# Altium footprint library bethu.PcbLib: 628 footprints (part 10 of 40)
Each footprint in its own frame and in the unit in brackets; x right, y up, seen from the top. Pads: shape width x height; smd on the part's side, far side on the other; paste and mask are expansions set on the pad; w line width, h text height; cw(c..) or ccw(c..) is an arc to the next point about the centre after c.
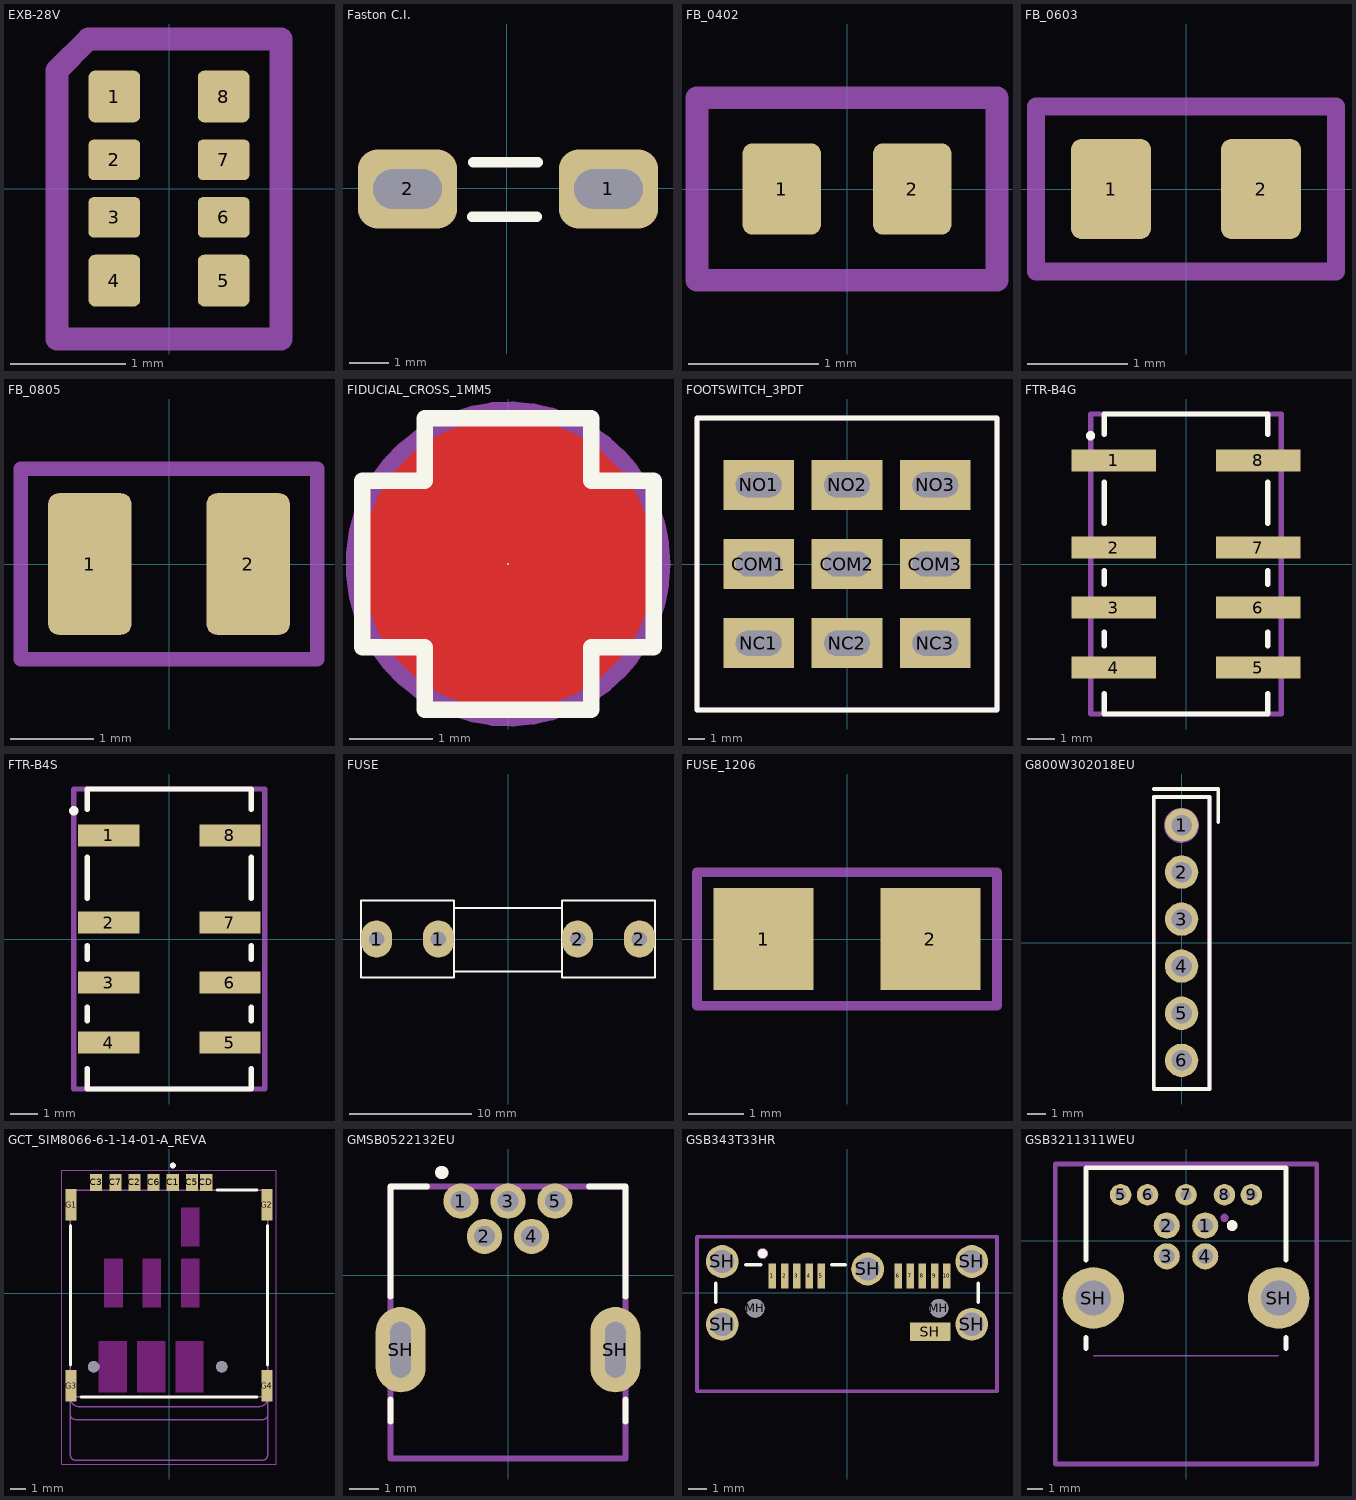
[diagram p9: the footprints below, top view; thin cyan lines are the x and y axes]

## EXB-28V [mm]
pads (8):
  rrect25% 0.45x0.45 smd mask+0.1: 1(-0.475,0.8) 4(-0.475,-0.8) 5(0.475,-0.8) 8(0.475,0.8)
  rrect25% 0.45x0.35 smd mask+0.1: 2(-0.475,0.25) 3(-0.475,-0.25) 6(0.475,-0.25) 7(0.475,0.25)
Mechanical 13:
  lines w0.2: -0.975,-1.308 -0.975,1.025 -0.7,1.3 0.975,1.3 0.975,-1.308 -0.975,-1.308
  text "'.Designator'" at -5.665,-0.417 h1
3D body "R-Array-0402.step": height 0.45, standoff 0, extent -0.5,-1 0.5,1

## Faston C.I. [mm]
pads (2):
  rrect50% 2.5x2 hole 1 slot 1.73 at 0 deg: 1(2.575,-0.025) 2(-2.5,-0.025)
Top Overlay:
  lines w0.254: -0.875,-0.725 0.775,-0.725 ; -0.85,0.65 0.8,0.65
3D body "amp faston tab 63824.step": height 11.52, standoff -2.5, extent -3.925,-1.57 3.995,1.52

## FB_0402 [mm]
pads (2):
  rrect25% 0.6x0.7 smd: 1(-0.5,0) 2(0.5,0)
Mechanical 13:
  lines w0.175: -1.15,-0.7 -1.15,0.7 1.15,0.7 1.15,-0.7 -1.15,-0.7
  text "'.Designator'" at -5.665,-0.417 h1
3D body "FB0402.stp": height 0.51, standoff 0.01, extent -0.5,-0.25 0.5,0.25

## FB_0603 [mm]
pads (2):
  rrect25% 0.8x1 smd: 1(-0.75,0) 2(0.75,0)
Mechanical 13:
  lines w0.175: -1.5,-0.825 1.5,-0.825 1.5,0.825 -1.5,0.825 -1.5,-0.825
  text "'.Designator'" at -5.665,-0.417 h1
3D body "FB-0603.STEP": height 0.81, standoff 0.01, extent -0.8,-0.4 0.8,0.4

## FB_0805 [mm]
pads (2):
  rrect25% 1x1.7 smd: 1(-0.95,0) 2(0.95,0)
Mechanical 13:
  lines w0.175: -1.778,-1.143 -1.778,1.143 1.778,1.143 1.778,-1.143 -1.778,-1.143
  text "'.Designator'" at -5.665,-0.417 h1
3D body "FB_0805.STEP": height 0.86, standoff 0.01, extent -1,-0.625 1,0.625

## FIDUCIAL_CROSS_1MM5 [mil]
pads (1):
  round 1 smd paste-19.68: FM(0,0)
Top Layer:
  region: -9.84,-29.53 -9.84,-9.84 -29.53,-9.84 -29.53,9.84 -9.84,9.84 -9.84,29.53 9.84,29.53 9.84,9.84 29.53,9.84 29.53,-9.84 9.84,-9.84 9.84,-29.53
  pour cut-out: 0,68.9 6.79,68.9 20.1,66.25 32.64,61.06 43.92,53.52 53.52,43.92 61.06,32.64 66.25,20.1 68.9,6.79 68.9,0 68.9,-6.79 66.25,-20.1 61.06,-32.64 53.52,-43.92 43.92,-53.52 32.64,-61.06 20.1,-66.25 6.79,-68.9 0,-68.9 -6.79,-68.9 -20.1,-66.25 -32.64,-61.06 -43.92,-53.52 -53.52,-43.92 -61.06,-32.64 -66.25,-20.1 -68.9,-6.79 -68.9,0 -68.9,6.79 -66.25,20.1 -61.06,32.64 -53.52,43.92 -43.92,53.52 -32.64,61.06 -20.1,66.25 -6.79,68.9
Top Overlay:
  lines w7.87: -68.9,-39.37 -39.37,-39.37 -39.37,-68.9 39.37,-68.9 39.37,-39.37 68.9,-39.37 68.9,39.37 39.37,39.37 39.37,68.9 -39.37,68.9 -39.37,39.37 -68.9,39.37 -68.9,0 -68.9,-39.37
Top Solder:
  region: -59.06,29.53 -29.53,29.53 -29.53,59.06 29.53,59.06 29.53,29.53 59.06,29.53 59.06,-29.53 29.53,-29.53 29.53,-59.06 -29.53,-59.06 -29.53,-29.53 -59.06,-29.53
Mechanical 13:
  circle w11.81: c0,0 r70.98
  text "'.Designator'" at -223.03,-16.4 h39.37

## FOOTSWITCH_3PDT [mm]
pads (9):
  rect 4.25x3 hole 1.5 slot 2.75 at 0 deg: COM1(-5.3,0) COM2(0,0) COM3(5.3,0) NC1(-5.3,-4.75) NC2(0,-4.75) NC3(5.3,-4.75) NO1(-5.3,4.75) NO2(0,4.75) NO3(5.3,4.75)
Top Overlay:
  lines w0.3: -9,-8.75 -9,8.75 -6.5,8.75 9,8.75 9,-8.75 -9,-8.75
Mechanical 13:
  lines w0.3: -9,-8.75 -9,8.75 9,8.75 9,-8.75 -9,-8.75
  text "'.Designator'" at -5.665,-0.417 h1
3D body "3PDT_Footswitch_NoNutNoWasher.step": height 37.96, standoff -4.14, extent -9.8,-8.5 9.8,8.5

## FTR-B4G [mm]
pads (8):
  rect 3.1x0.8 smd: 1(-2.65,3.8) 2(-2.65,0.6) 3(-2.65,-1.6) 4(-2.65,-3.8) 5(2.65,-3.8) 6(2.65,-1.6) 7(2.65,0.6) 8(2.65,3.8)
Top Overlay:
  circle w0.3: c-3.5,4.7 r0.021
  lines w0.2: -3,-4.75 -3,-5.5 3,-5.5 3,-4.75 ; -3,-3 -3,-2.5 ; -3,-0.75 -3,-0.25 ; -3,1.5 -3,3 ; -3,4.75 -3,5.5 3,5.5 3,4.75 ; 3,-3 3,-2.5 ; 3,-0.75 3,-0.25 ; 3,1.5 3,3
Mechanical 13:
  circle w0.3: c-2.2,3.8 r0.108
  lines w0.2: -3.5,-5.5 3.5,-5.5 3.5,5.5 -3.5,5.5 -3.5,-5.5
  text ".Designator" at -4.998,-0.333 h1
3D body "FTR-B4G.step": height 9.72, standoff 0.01, extent -3.706,-5.3 3.7,5.3

## FTR-B4S [mm]
pads (8):
  rect 2.25x0.8 smd: 1(-2.225,3.8) 2(-2.225,0.6) 3(-2.225,-1.6) 4(-2.225,-3.8) 5(2.225,-3.8) 6(2.225,-1.6) 7(2.225,0.6) 8(2.225,3.8)
Top Overlay:
  circle w0.3: c-3.5,4.7 r0.021
  lines w0.2: -3,-4.75 -3,-5.5 3,-5.5 3,-4.75 ; -3,-3 -3,-2.5 ; -3,-0.75 -3,-0.25 ; -3,1.5 -3,3 ; -3,4.75 -3,5.5 3,5.5 3,4.75 ; 3,-3 3,-2.5 ; 3,-0.75 3,-0.25 ; 3,1.5 3,3
Mechanical 13:
  circle w0.3: c-2.2,3.8 r0.108
  lines w0.2: -3.5,-5.5 3.5,-5.5 3.5,5.5 -3.5,5.5 -3.5,-5.5
  text ".Designator" at -4.998,-0.333 h1
3D body "FTR-B4S.step": height 9.72, standoff 0.01, extent -2.852,-5.3 2.85,5.3

## FUSE [mil]
pads (4):
  oval 100x120 hole 50: 1(-425,0) 1(-225,0) 2(225,0) 2(425,0)
Top Overlay:
  lines w7: -175,-105 175,-105 ; -175,100 175,100 ; -475,-125 -175,-125 -175,125 -475,125 -475,-125 ; 175,-125 175,125 475,125 475,-125 175,-125
3D body "SW3dPS-Fuse Leg_2009.STEP": height 377.88, standoff -129.94, extent -448,-117 -208,126.71
3D body "SW3dPS-Fuse Small 1A.STEP": height 370.39, standoff 169.61, extent -384.8,-98 390.8,102.79
3D body "SW3dPS-Fuse Leg_2009.STEP": height 377.88, standoff -129.94, extent 219,-116.71 459,127

## FUSE_1206 [mm]
pads (2):
  rect 1.8x1.84 smd: 1(-1.5,0) 2(1.5,0)
Mechanical 13:
  lines w0.175: -2.7,-1.2 -2.7,1.2 2.7,1.2 2.7,-1.2 -2.7,-1.2
  text "'.Designator'" at -5.665,-0.417 h1
3D body "Fuse_1206.stp": height 0.84, standoff 0.01, extent -1.652,-0.815 1.652,0.815

## G800W302018EU [mm]
pads (6):
  round 1.8 hole 1.1 mask+0.07: 1(0,6.35) 2(0,3.81) 3(0,1.27) 4(0,-1.27) 5(0,-3.81) 6(0,-6.35)
Top Overlay:
  lines w0.2: -1.5,8.3 1.972,8.3 1.972,6.5 ; -1.5,-7.9 -1.5,7.863 1.5,7.863 1.5,-7.9 -1.5,-7.9
Mechanical 13:
  circle w0.25: c-0.012,6.336 r0.823
  lines w0.2: -1.5,-7.9 -1.5,7.864 1.5,7.864 1.5,-7.9 -1.5,-7.9
  text "'.Designator'" at -5.84,-0.925 h1
3D body "g800w302xxxeu.stp": height 8.61, standoff -2.99, extent -1.25,-7.62 1.25,7.62

## GCT_SIM8066-6-1-14-01-A_REVA [mm]
pads (13):
  rect 0.8x1.14 smd: C1(0.25,7.37) C2(-2.29,7.37) C3(-4.83,7.37) C5(1.52,7.37) C6(-1.02,7.37) C7(-3.56,7.37) CD(2.47,7.37)
  rect 0.7x2.1 smd: G1(-6.5,5.89) G2(6.5,5.89) G3(-6.5,-6.11) G4(6.5,-6.11)
  round 0.75 hole 0.75 unplated: ""(-5,-4.86) ""(3.5,-4.86)
Top Overlay:
  circle w0.2: c0.25,8.49 r0.1
  lines w0.2: -6.545,-4.74 -6.545,4.52 ; -5.83,-6.86 5.83,-6.86 ; 3.19,6.86 5.83,6.86 ; 6.545,-4.74 6.545,4.52
Keep-Out Layer:
  region: -3.08,-0.915 -4.28,-0.915 -4.28,2.295 -3.08,2.295
  region: -0.54,-0.915 -1.74,-0.915 -1.74,2.295 -0.54,2.295
  region: 2,-0.915 0.8,-0.915 0.8,2.295 2,2.295
  region: 2.285,-6.56 0.435,-6.56 0.435,-3.16 2.285,-3.16
  region: -2.795,-6.56 -4.645,-6.56 -4.645,-3.16 -2.795,-3.16
  region: -0.255,-6.56 -2.105,-6.56 -2.105,-3.16 -0.255,-3.16
  region: 2,3.135 0.8,3.135 0.8,5.685 2,5.685
Mechanical 13:
  circle w0.2: c0.25,8.49 r0.1
  lines w0.1: -6.545,-10.713 ccw(c-6.198,-10.713) -6.198,-11.06 ; -6.545,-10.71 -6.545,-8.01 -6.545,-6.86 ; -6.545,-8.013 ccw(c-6.198,-8.013) -6.198,-8.36 ; -6.2,-11.06 6.2,-11.06 ; -6.2,-8.36 6.2,-8.36 ccw(c6.222,-8.037) 6.545,-8.06 ; 6.198,-11.06 ccw(c6.198,-10.713) 6.545,-10.713 ; 6.545,-10.71 6.545,-8.06 ; -6.545,-6.86 ccw(c-5.947,-6.913) -6,-7.51 6,-7.51 ccw(c5.947,-6.913) 6.545,-6.86 ; -6.545,-6.86 6.545,-6.86 ; -6.545,-6.86 -6.545,6.86 6.545,6.86 6.545,-6.86 ; 6.545,-8.06 6.545,-6.86
Mechanical 15:
  lines w0.05: -7.1,-11.31 7.1,-11.31 7.1,8.19 -7.1,8.19 -7.1,-11.31
3D body "sim8066-6-1-14-01-a.stp": height 1.5, standoff -0.31, extent -6.596,-7.088 6.494,7.468

## GMSB0522132EU [mm]
pads (7):
  round 1.2 hole 0.7 mask+0.3: 1(-1.6,2.525) 2(-0.8,1.325) 3(0,2.525) 4(0.8,1.325) 5(1.6,2.525)
  oval 1.7x2.9 hole 0.7 slot 1.9 at 90 deg: SH(-3.65,-2.525) SH(3.65,-2.525)
Top Overlay:
  circle w0.25: c-2.25,3.5 r0.1
  lines w0.2: -4,-4.975 -4,-4.225 ; -4,-0.725 -4,3.025 -2.75,3.025 ; 2.75,3.025 4,3.025 4,-0.725 ; 4,-4.975 4,-4.225
Mechanical 13:
  circle w0.25: c-2.25,3.5 r0.1
  lines w0.2: -4,-6.225 -4,3.025 4,3.025 4,-6.225 -4,-6.225
  text "'.Designator'" at -5.665,-0.417 h1
3D body "GMSB0522132EU.stp": height 3.91, standoff -2.84, extent -3.95,-6.275 3.95,3.125

## GSB343T33HR [mm]
pads (18):
  rrect10% 0.4x1.35 smd: 1(-3.975,0.905) 2(-3.325,0.905) 3(-2.675,0.905) 4(-2.025,0.905) 5(-1.375,0.905) 6(2.725,0.905) 7(3.375,0.905) 8(4.025,0.905) 9(4.675,0.905) 10(5.325,0.905)
  round 1 hole 1 unplated: MH(-4.9,-0.825) MH(4.9,-0.825)
  round 1.75 hole 1.25: SH(-6.65,-1.675) SH(-6.65,1.675) SH(1.1,1.275) SH(6.65,-1.675) SH(6.65,1.675)
  rrect10% 2.18x0.98 smd: SH(4.44,-2.065)
Top Overlay:
  circle w0.3: c-4.5,2.1 r0.1
  lines w0.2: -7,-0.5 -7,0.5 ; -5.4,1.5 -4.6,1.5 ; -0.8,1.5 -0.1,1.5 ; 7,-0.5 7,0.5
Mechanical 13:
  circle w0.3: c-4.5,2.1 r0.141
  lines w0.2: -8,-5.25 8,-5.25 8,3 -8,3 -8,-1.75 -8,-5.25
  text "'.Designator'" at -5.665,-0.417 h1
3D body "gsb343t33hr.stp": height 5.5, standoff -0.75, extent -6.78,-5.078 6.77,2.175

## GSB3211311WEU [mm]
pads (11):
  round 1.7 hole 1: 1(1.25,1) 2(-1.25,1) 3(-1.25,-1) 4(1.25,-1)
  round 1.4 hole 0.7: 5(-4.25,3) 6(-2.5,3) 7(0,3) 8(2.5,3) 9(4.25,3)
  round 4 hole 2.3: SH(-6.02,-3.71) SH(6.02,-3.71)
Top Overlay:
  circle w0.5: c3,1 r0.1
  lines w0.3: -6.5,-7 -6.5,-6.25 ; -6.5,-1.25 -6.5,4.75 6.5,4.75 6.5,-1.25 ; 6.5,-7 6.5,-6.25
Mechanical 13:
  circle w0.3: c2.5,1.5 r0.118
  lines w0.12: -6,-7.46 6,-7.46
  lines w0.3: -8.5,-14.5 8.5,-14.5 8.5,5 -8.5,5 -8.5,-14.5
  text "PCB EDGE" at -2.032,-7.2 h0.5
  text "'.Designator'" at -5.815,-0.9 h1
3D body "gsb3211311weu.stp": height 13.13, standoff -4.09, extent -6.3,-13.95 6.3,4.4